# Altium footprint library LimeMicroAltiumLib_pcbLib_r05.PcbLib: 746 footprints (part 36 of 48)
Each footprint in its own frame and in the unit in brackets; x right, y up, seen from the top. Pads: shape width x height; smd on the part's side, far side on the other; paste and mask are expansions set on the pad; w line width, h text height; cw(c..) or ccw(c..) is an arc to the next point about the centre after c.
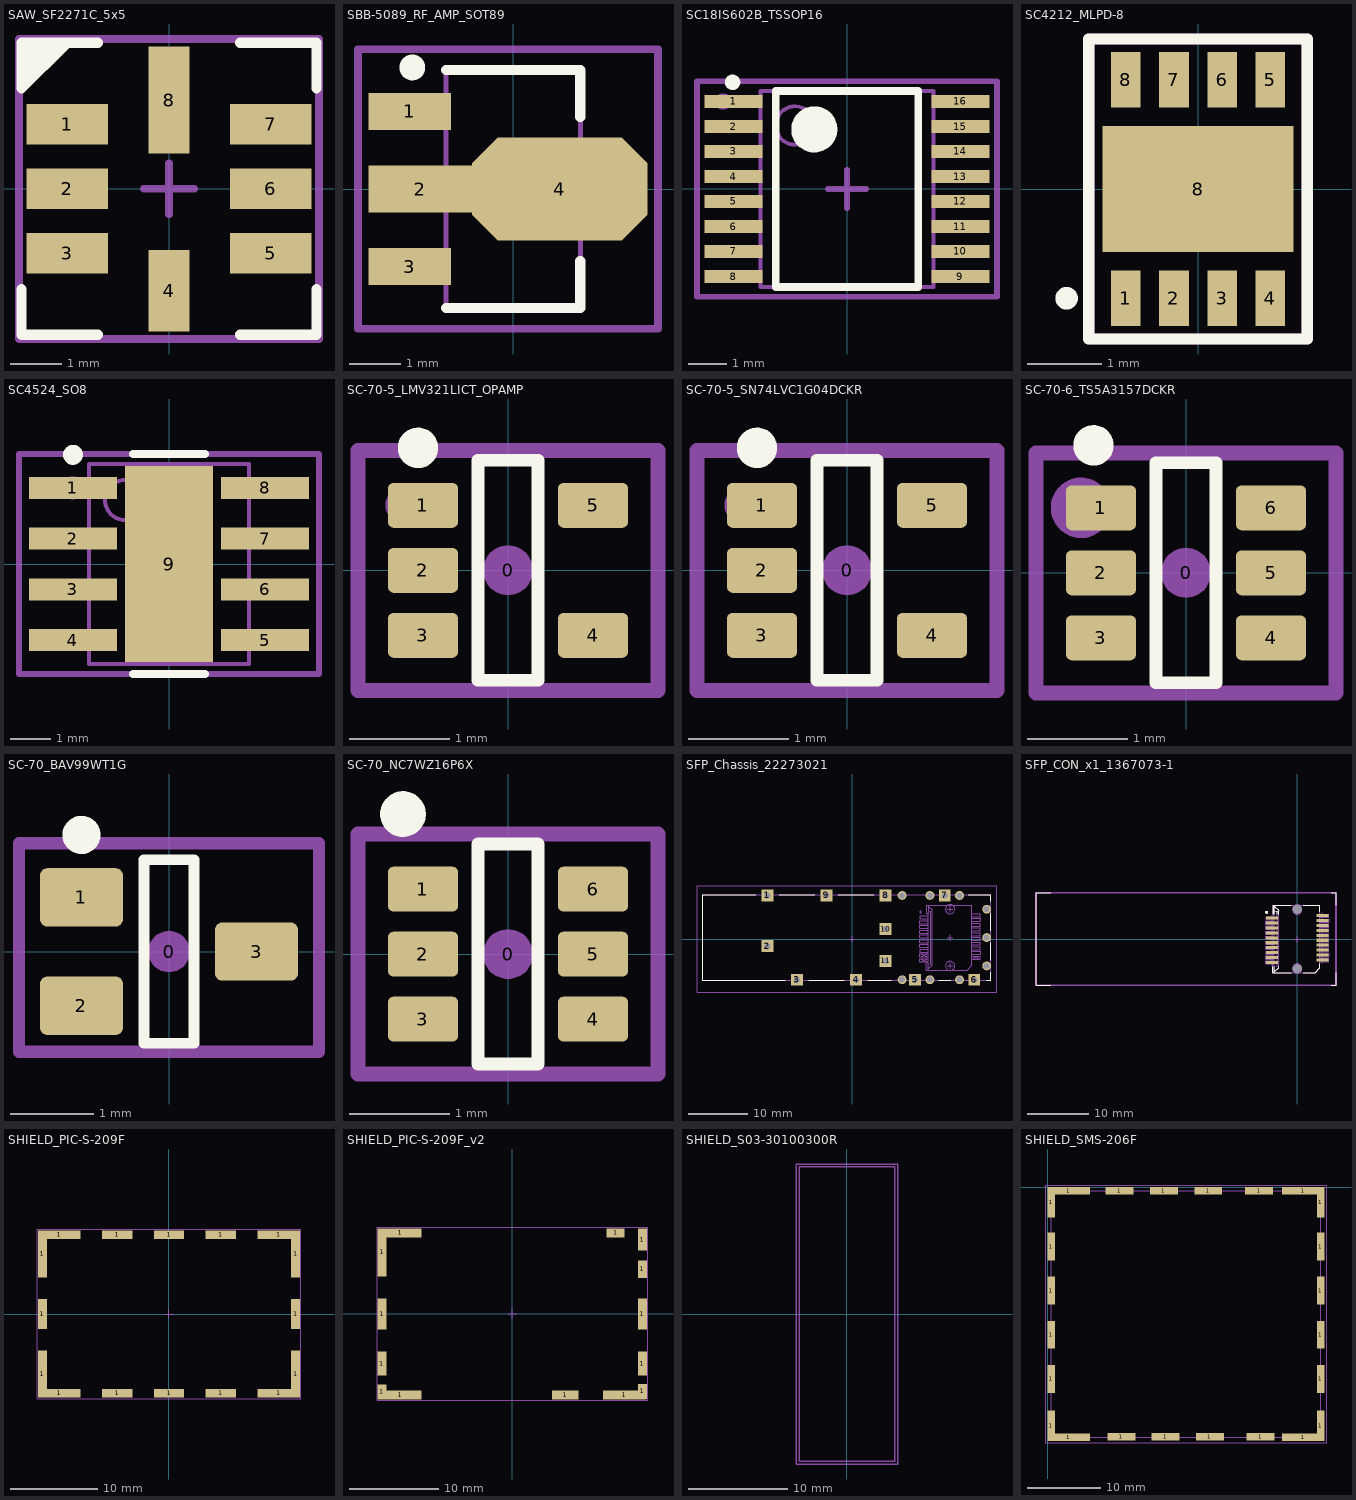
[diagram p35: the footprints below, top view; thin cyan lines are the x and y axes]

## SAW_SF2271C_5x5 [mm]
pads (8):
  rect 1.6x0.8 smd mask+0.05: 1(-2,1.27) 2(-2,0) 3(-2,-1.27) 5(2,-1.27) 6(2,0) 7(2,1.27)
  rect 0.8x1.6 smd mask+0.05: 4(0,-2.005)
  rect 0.8x2.1 smd mask+0.05: 8(0,1.745)
Top Overlay:
  region: -2.9,1.9 -2,2.8 -2,2.9 -2.87,2.9 -2.9,2.87
  lines w0.2: -2.9,-1.97 -2.9,-2.87 -1.4,-2.87 ; -2.035,2.835 -2.9,1.97 -2.9,2.87 -1.4,2.87 ; 1.4,-2.87 2.9,-2.87 2.9,-1.97 ; 1.4,2.87 2.9,2.87 2.9,1.97
Mechanical 15:
  circle w0.25: c-2,1.3 r0.1
  lines w0.15: -0.5,0 0.5,0 ; 0,-0.5 0,0.5 ; -2.95,-2.955 2.95,-2.955 2.95,2.945 -2.95,2.945 -2.95,-2.955
  text ".Designator" at 0,0 h0.55
3D body "User Library-TA0731.step": height 1.7, standoff 0, extent -2.5,-2.5 2.5,2.5

## SBB-5089_RF_AMP_SOT89 [mm]
pads (4):
  rect 1.6x0.711 smd: 1(-2,1.5) 3(-2,-1.5)
  rect 2x0.914 smd: 2(-1.8,0)
  oct 3.4x2 smd: 4(0.9,0)
Top Overlay:
  circle w0.25: c-1.95,2.35 r0.125
  lines w0.2: -1.3,-2.3 1.3,-2.3 1.3,-1.4 ; -1.3,2.3 1.3,2.3 1.3,1.4
Mechanical 13:
  lines w0.1: -1.3,-2.3 1.3,-2.3 1.3,2.3 -1.3,2.3 -1.3,-2.3
Mechanical 15:
  circle w0.15: c-2.125,1.5 r0.056
  lines w0.15: -0.5,0 0.5,0 ; 0,-0.5 0,0.5 ; -3,-2.7 2.8,-2.7 2.8,2.7 -3,2.7 -3,-2.7
  text ".Designator" at 0,0 h0.55
3D body "SW3dPS-SOT89.STEP": height 1.59, standoff -0.02, extent -2.408,-2.286 1.842,2.314

## SC18IS602B_TSSOP16 [mm]
pads (16):
  rect 1.5x0.35 smd mask+0.05: 1(-2.95,2.275) 2(-2.95,1.625) 3(-2.95,0.975) 4(-2.95,0.325) 5(-2.95,-0.325) 6(-2.95,-0.975) 7(-2.95,-1.625) 8(-2.95,-2.275) 9(2.95,-2.275) 10(2.95,-1.625) 11(2.95,-0.975) 12(2.95,-0.325) 13(2.95,0.325) 14(2.95,0.975) 15(2.95,1.625) 16(2.95,2.275)
Top Overlay:
  circle w0.6: c-0.85,1.55 r0.3
  circle w0.25: c-2.975,2.775 r0.075
  lines w0.2: -1.85,-2.55 1.85,-2.55 1.85,2.55 -1.85,2.55 -1.85,-2.55
Mechanical 13:
  circle w0.1: c-1.35,1.65 r0.5
  lines w0.1: -2.25,-2.55 2.25,-2.55 2.25,2.55 -2.25,2.55 -2.25,-2.55
Mechanical 15:
  circle w0.35: c-3.225,2.275 r0.035
  lines w0.15: -0.5,0 0.5,0 ; 0,-0.5 0,0.5 ; -3.9,-2.8 3.9,-2.8 3.9,2.8 -3.9,2.8 -3.9,-2.8
  text ".Designator" at 0,0 h0.55
3D body "User Library-TSSOP-16-1.step": height 1.1, standoff 0, extent -3.2,-2.5 3.2,2.5

## SC4212_MLPD-8 [mm] "SC4212"
height 1.5
pads (9):
  rect 0.4x0.75 smd mask+0.05: 1(-0.975,-1.475) 2(-0.325,-1.475) 3(0.325,-1.475) 4(0.975,-1.475) 5(0.975,1.475) 6(0.325,1.475) 7(-0.325,1.475) 8(-0.975,1.475)
  rect 2.58x1.7 smd mask+0.05: 8(0,0)
Top Overlay:
  circle w0.254: c-1.775,-1.475 r0.025
  lines w0.15: -1.475,-2.025 1.475,-2.025 1.475,2.025 -1.475,2.025 -1.475,-2.025
Mechanical 15:
  circle w0.254: c-0.975,-1.475 r0.025
  lines w0.15: -0.45,0 0,0 ; 0,-0.45 0,0 ; 0,0.45 0,0 ; 0.45,0 0,0 ; -1.475,-2.025 1.475,-2.025 1.475,2.025 -1.475,2.025 -1.475,-2.025
  text ".Designator" at 0,0 h0.55
3D body: height 1, standoff 0, extent -1.5,-1.6 1.5,1.7
3D body: height 1.01, standoff 0, extent -1.2,-1.4 -0.8,-1

## SC4524_SO8 [mm] "SOIC, 8-Leads, Body 4,90x3,90mm, Pitch 1,27mm, IPC Medium Density"
height 1.7
pads (9):
  rect 2.2x0.55 smd mask+0.05: 1(-2.4,1.905) 2(-2.4,0.635) 3(-2.4,-0.635) 4(-2.4,-1.905) 5(2.4,-1.905) 6(2.4,-0.635) 7(2.4,0.635) 8(2.4,1.905)
  rect 2.2x4.9 smd mask+0.05: 9(0,0)
Top Overlay:
  circle w0.25: c-2.4,2.73 r0.125
  lines w0.2: -0.9,-2.75 0.9,-2.75 ; -0.9,2.75 0.9,2.75
Mechanical 13:
  circle w0.1: c-1.1,1.6 r0.5
  lines w0.1: -2,-2.5 2,-2.5 2,2.5 -2,2.5 -2,-2.5
Mechanical 15:
  circle w0.35: c-2.4,1.905 r0.112
  lines w0.15: -0.5,0 0.5,0 ; 0,-0.5 0,0.5 ; -3.75,-2.75 3.75,-2.75 3.75,2.75 -3.75,2.75 -3.75,-2.75
  text ".Designator" at 0,-0.1 h0.55
3D body "CircuitWorks-SO-8.step": height 1.45, standoff 0, extent -2.9,-2.402 2.878,2.5

## SC-70-5_LMV321LICT_OPAMP [mm] "SC-70 (SOT323), 5 pin"
height 1.003
pads (6):
  round 0.5 on Mech15: 0(0,0)
  rrect25% 0.7x0.45 smd: 1(-0.85,0.65) 2(-0.85,0) 3(-0.85,-0.65) 4(0.85,-0.65) 5(0.85,0.65)
Top Overlay:
  circle w0.2: c-0.9,1.225 r0.102
  lines w0.127: -0.3,-1.1 -0.3,1.1 0.3,1.1 0.3,-1.1 -0.3,-1.1
Top Solder:
  region: -1.3,-0.975 -1.3,0.975 -0.4,0.975 -0.4,-0.975
Mechanical 15:
  circle w0.2: c-1.05,0.65 r0.075
  lines w0.15: -1.5,-1.2 -1.5,1.2 1.5,1.2 1.5,-1.2 -1.5,-1.2
  text ".Designator" at 0,0 h0.55
3D body "User Library-SC70-6.step": height 0.92, standoff -0.03, extent -1.05,-1 1.05,1

## SC-70-5_SN74LVC1G04DCKR [mm] "SC-70 (SOT323), 5 pin"
height 1.003
pads (6):
  round 0.5 on Mech15: 0(0,0)
  rrect25% 0.7x0.45 smd: 1(-0.85,0.65) 2(-0.85,0) 3(-0.85,-0.65) 4(0.85,-0.65) 5(0.85,0.65)
Top Overlay:
  circle w0.2: c-0.9,1.225 r0.102
  lines w0.127: -0.3,-1.1 -0.3,1.1 0.3,1.1 0.3,-1.1 -0.3,-1.1
Top Solder:
  region: -1.3,-0.975 -1.3,0.975 -0.4,0.975 -0.4,-0.975
Mechanical 15:
  circle w0.2: c-1.05,0.65 r0.075
  lines w0.15: -1.5,-1.2 -1.5,1.2 1.5,1.2 1.5,-1.2 -1.5,-1.2
  text ".Designator" at 0,0 h0.55
3D body "User Library-SC70-6.step": height 0.92, standoff -0.03, extent -1.05,-1 1.05,1

## SC-70-6_TS5A3157DCKR [mm] "SC-70 (SOT323), 6 pin"
height 1.003
pads (7):
  round 0.5 on Mech15: 0(0,0)
  rrect25% 0.7x0.45 smd: 1(-0.85,0.65) 2(-0.85,0) 3(-0.85,-0.65) 4(0.85,-0.65) 5(0.85,0) 6(0.85,0.65)
Top Overlay:
  circle w0.2: c-0.925,1.275 r0.102
  lines w0.127: -0.3,-1.1 0.3,-1.1 0.3,1.1 -0.3,1.1 -0.3,-1.1
Top Solder:
  region: 1.3,-0.975 0.4,-0.975 0.4,0.975 1.3,0.975
  region: -1.3,-0.975 -0.4,-0.975 -0.4,0.975 -1.3,0.975
  region: -1.3,-0.975
Mechanical 15:
  circle w0.35: c-1.05,0.65 r0.127
  lines w0.15: -1.5,-1.2 1.5,-1.2 1.5,1.2 -1.5,1.2 -1.5,-1.2
  text ".Designator" at 0,0 h0.55
3D body "User Library-SC70-6.step": height 0.92, standoff -0.03, extent -1.05,-1 1.05,1

## SC-70_BAV99WT1G [mm] "SC-70 (SOT323), 3 pin"
height 1.003
pads (4):
  round 0.5 on Mech15: 0(0,0)
  rrect25% 1x0.7 smd: 1(-1.05,0.65) 2(-1.05,-0.65) 3(1.05,0)
Top Overlay:
  circle w0.254: c-1.05,1.4 r0.102
  lines w0.127: -0.3,-1.1 0.3,-1.1 0.3,1.1 -0.3,1.1 -0.3,-1.1
Mechanical 15:
  circle w0.2: c-1.05,0.65 r0.05
  lines w0.15: -1.8,-1.2 1.8,-1.2 1.8,1.3 -1.8,1.3 -1.8,-1.2
  text ".Designator" at 0,0 h0.55
3D body "User Library-sc70-3.step": height 0.99, standoff -0.01, extent -1.15,-1.05 1.15,1.05

## SC-70_NC7WZ16P6X [mm] "SC-70 (SOT323), 6 pin"
height 1.003
pads (7):
  round 0.5 on Mech15: 0(0,0)
  rrect25% 0.7x0.45 smd: 1(-0.85,0.65) 2(-0.85,0) 3(-0.85,-0.65) 4(0.85,-0.65) 5(0.85,0) 6(0.85,0.65)
Top Overlay:
  circle w0.254: c-1.05,1.4 r0.102
  lines w0.127: -0.3,-1.1 0.3,-1.1 0.3,1.1 -0.3,1.1 -0.3,-1.1
Top Solder:
  region: 1.3,-0.975 1.3,0.975 0.4,0.975 0.4,-0.975
  region: -1.3,-0.975 -1.3,0.975 -0.4,0.975 -0.4,-0.975
Mechanical 15:
  circle w0.2: c-1.05,0.65 r0.05
  lines w0.15: -1.5,-1.2 1.5,-1.2 1.5,1.2 -1.5,1.2 -1.5,-1.2
  text ".Designator" at 0,0 h0.55
3D body "User Library-SC70-6.step": height 0.92, standoff -0.03, extent -1.05,-1 1.05,1

## SFP_Chassis_22273021 [mm] "CONN SFP CAGE PRESS-FIT R/A"
pads (20):
  rect 2x2 hole 1.05: 1(-14.351,7.366) 2(-14.351,-1.209) 3(-9.351,-6.884) 4(0.649,-6.884) 5(10.649,-6.884) 6(20.649,-6.884) 7(15.649,7.366) 8(5.649,7.366) 9(-4.351,7.366) 10(5.649,1.691) 11(5.649,-3.709)
  round 1.5 hole 1: 12(8.449,-6.884) 13(13.149,-6.884) 14(18.149,-6.884) 15(22.749,-4.559) 16(22.749,0.241) 17(18.149,7.366) 18(13.149,7.366) 19(8.449,7.366) 20(22.749,5.041)
Top Overlay:
  lines w0.2: -16.351,7.491 -25.251,7.491 -25.251,-7.009 -11.351,-7.009 ; -12.351,7.491 -6.351,7.491 ; -7.351,-7.009 -1.351,-7.009 ; -2.351,7.491 3.649,7.491 ; 2.649,-7.009 6.649,-7.009 ; 14.649,-7.009 16.649,-7.009 ; 19.649,7.491 23.449,7.491 23.449,6.366 ; 22.749,-7.009 23.449,-7.009 23.449,-5.634 ; 23.449,-3.634 23.449,-0.634 ; 23.449,1.366 23.449,4.366
Mechanical 13:
  circle w0.1: c11.594,4.564 r0.125
  circle w0.1: c16.549,-4.559 r0.775
  circle w0.1: c16.549,5.041 r0.775
  lines w0.1: 12.849,-5.259 12.849,-3.859 ; 12.849,-5.059 13.569,-4.459 13.569,-4.259 ; 12.849,-4.196 13.569,-4.259 ; 12.849,-2.209 11.449,-2.209 11.449,-1.709 12.849,-1.709 ; 12.849,-1.409 11.449,-1.409 11.449,-0.909 12.849,-0.909 ; 12.849,-0.609 11.449,-0.609 11.449,-0.109 12.849,-0.109 ; 12.849,0.191 11.449,0.191 11.449,0.691 12.849,0.691 ; 12.849,0.991 11.449,0.991 11.449,1.491 12.849,1.491 ; 12.849,1.791 11.449,1.791 11.449,2.291 12.849,2.291 ; 12.849,2.591 11.449,2.591 11.449,3.091 12.849,3.091 ; 12.849,3.391 11.449,3.391 11.449,3.891 12.849,3.891 ; 12.849,4.678 13.569,4.741 ; 12.849,5.541 13.564,4.941 13.569,4.941 13.569,4.741 ; 12.849,5.741 12.849,4.341 ; 13.326,-4.238 13.326,4.72 ; 16.049,-4.559 16.549,-4.559 ; 16.049,0.246 16.549,0.246 ; 16.049,5.041 16.549,5.041 ; 16.549,-5.059 16.549,-4.559 ; 16.549,-4.059 16.549,-4.559 ; 16.549,-0.254 16.549,0.246 ; 16.549,0.746 16.549,0.246 ; 16.549,4.541 16.549,5.041 ; 16.549,5.541 16.549,5.041 ; 17.049,-4.559 16.549,-4.559 ; 17.049,0.246 16.549,0.246 ; 17.049,5.041 16.549,5.041 ; 20.249,-2.609 21.649,-2.609 21.649,-2.109 20.249,-2.109 ; 20.249,-1.809 21.649,-1.809 21.649,-1.309 20.249,-1.309 ; 20.249,-1.009 21.649,-1.009 21.649,-0.509 20.249,-0.509 ; 20.249,-0.209 21.649,-0.209 21.649,0.291 20.249,0.291 ; 20.249,0.591 21.649,0.591 21.649,1.091 20.249,1.091 ; 20.249,1.391 21.649,1.391 21.649,1.891 20.249,1.891 ; 20.249,2.191 21.649,2.191 21.649,2.691 20.249,2.691 ; 20.249,2.991 21.649,2.991 21.649,3.491 20.249,3.491 ; 20.249,3.791 21.649,3.791 21.649,4.291 20.249,4.291 ; 11.449,-3.809 12.849,-3.309 11.449,-3.309 ; 11.449,-3.809 11.449,-3.309 ; 11.449,-3.809 12.849,-3.809 11.449,-3.309 ; 11.449,-3.009 12.849,-2.509 11.449,-2.509 ; 11.449,-3.009 11.449,-2.509 ; 11.449,-3.009 12.849,-3.009 11.449,-2.509 ; 12.849,-3.859 12.549,-3.859 12.549,-5.259 19.449,-5.259 20.249,-4.459 20.249,5.741 12.549,5.741 12.549,4.341 12.849,4.341 ; 12.849,-3.859 12.849,4.341 ; 13.569,-4.259 13.569,4.741 ; 21.649,-3.409 20.249,-2.909 21.649,-2.909 ; 21.649,-3.409 21.649,-2.909 ; 21.649,-3.409 20.249,-3.409 21.649,-2.909
  lines w0.2: -25.251,-7.009 -25.251,7.491 23.449,7.491 23.449,-7.009 -25.251,-7.009
Mechanical 15:
  lines w0.15: -0.5,0 0.5,0 ; 0,-0.5 0,0.5
  lines w0.2: -26.251,-9 -26.251,9 24.499,9 24.499,-9 -26.251,-9
  text ".Designator" at 0,0 h0.55
3D body "2227302-1.stp": height 10.43, standoff -2.95, extent -25.951,-7.726 22.749,8.118

## SFP_CON_x1_1367073-1 [mm] "CONN SFP RCPT 20POS SLD R/A SMD"
height 1.55
pads (22):
  rect 2x0.5 smd: 1(-4.1,3.395) 2(-4.1,2.595) 3(-4.1,1.795) 4(-4.1,0.995) 5(-4.1,0.195) 6(-4.1,-0.605) 7(-4.1,-1.405) 8(-4.1,-2.205) 9(-4.1,-3.005) 10(-4.1,-3.805) 11(4.1,-3.405) 12(4.1,-2.605) 13(4.1,-1.805) 14(4.1,-1.005) 15(4.1,-0.205) 16(4.1,0.595) 17(4.1,1.395) 18(4.1,2.195) 19(4.1,2.995) 20(4.1,3.795)
  round 1 hole 1.55 unplated mask+0.28: MTG1(0,4.795) MTG2(0,-4.805)
Top Overlay:
  circle w0.25: c-4.955,4.318 r0.125
  lines w0.2: -42.4,7.475 -42.4,-7.499 -40,-7.499 ; -42.4,7.499 -40,7.499 ; -4,-4.505 -4,-5.505 -0.944,-5.505 ; -3.7,-5.505 -3.7,-4.505 ; -3.7,-5.305 -2.98,-4.705 -2.98,-4.505 ; -3.7,4.045 -3.7,5.495 ; -3.7,4.095 -4,4.095 -4,5.495 -0.944,5.495 ; -3.7,4.432 -2.98,4.495 ; -3.7,5.295 -2.98,4.695 -2.98,4.045 ; -3.223,4.045 -3.223,4.474 ; 0.944,-5.505 2.9,-5.505 3.7,-4.705 3.7,-4.055 ; 0.944,5.495 3.7,5.495 3.7,4.445 ; 5.5,-7.499 6.3,-7.499 6.3,-5.502 ; 5.5,7.499 6.3,7.499 6.3,5.502
Mechanical 13:
  circle w0.1: c-4.955,4.318 r0.125
  circle w0.1: c0,-4.805 r0.775
  circle w0.1: c0,4.795 r0.775
  lines w0.1: -4.6,-3.805 -4.1,-3.805 -3.6,-3.805 ; -4.6,-3.005 -4.1,-3.005 -3.6,-3.005 ; -4.6,-2.205 -4.1,-2.205 -3.6,-2.205 ; -4.6,-1.405 -4.1,-1.405 -3.6,-1.405 ; -4.6,-0.605 -4.1,-0.605 -3.6,-0.605 ; -4.6,0.195 -4.1,0.195 -3.6,0.195 ; -4.6,0.995 -4.1,0.995 -3.6,0.995 ; -4.6,1.795 -4.1,1.795 -3.6,1.795 ; -4.6,2.595 -4.1,2.595 -3.6,2.595 ; -4.6,3.395 -4.1,3.395 -3.6,3.395 ; -4.1,-4.305 -4.1,3.895 ; -3.7,-5.505 -3.7,-4.105 ; -3.7,-5.305 -2.98,-4.705 -2.98,-4.505 ; -3.7,-4.442 -2.98,-4.505 ; -3.7,-4.055 -5.1,-4.055 -5.1,-3.555 -3.7,-3.555 ; -3.7,-3.255 -5.1,-3.255 -5.1,-2.755 -3.7,-2.755 ; -3.7,-2.455 -5.1,-2.455 -5.1,-1.955 -3.7,-1.955 ; -3.7,-1.655 -5.1,-1.655 -5.1,-1.155 -3.7,-1.155 ; -3.7,-0.855 -5.1,-0.855 -5.1,-0.355 -3.7,-0.355 ; -3.7,-0.055 -5.1,-0.055 -5.1,0.445 -3.7,0.445 ; -3.7,0.745 -5.1,0.745 -5.1,1.245 -3.7,1.245 ; -3.7,1.545 -5.1,1.545 -5.1,2.045 -3.7,2.045 ; -3.7,2.345 -5.1,2.345 -5.1,2.845 -3.7,2.845 ; -3.7,3.145 -5.1,3.145 -5.1,3.645 -3.7,3.645 ; -3.7,4.432 -2.98,4.495 ; -3.7,5.295 -2.985,4.695 -2.98,4.695 -2.98,4.495 ; -3.7,5.495 -3.7,4.095 ; -3.223,-4.484 -3.223,4.474 ; -0.5,-4.805 0,-4.805 ; -0.5,0 0,0 ; -0.5,4.795 0,4.795 ; 0,-5.305 0,-4.805 ; 0,-4.305 0,-4.805 ; 0,-0.5 0,0 ; 0,0.5 0,0 ; 0,4.295 0,4.795 ; 0,5.295 0,4.795 ; 0.5,-4.805 0,-4.805 ; 0.5,0 0,0 ; 0.5,4.795 0,4.795 ; 3.6,-3.405 4.1,-3.405 4.6,-3.405 ; 3.6,-2.605 4.1,-2.605 4.6,-2.605 ; 3.6,-1.805 4.1,-1.805 4.6,-1.805 ; 3.6,-1.005 4.1,-1.005 4.6,-1.005 ; 3.6,-0.205 4.1,-0.205 4.6,-0.205 ; 3.6,0.595 4.1,0.595 4.6,0.595 ; 3.6,1.395 4.1,1.395 4.6,1.395 ; 3.6,2.195 4.1,2.195 4.6,2.195 ; 3.6,2.995 4.1,2.995 4.6,2.995 ; 3.6,3.795 4.1,3.795 4.6,3.795 ; 3.7,-3.655 5.1,-3.655 5.1,-3.155 3.7,-3.155 ; 3.7,-2.855 5.1,-2.855 5.1,-2.355 3.7,-2.355 ; 3.7,-2.055 5.1,-2.055 5.1,-1.555 3.7,-1.555 ; 3.7,-1.255 5.1,-1.255 5.1,-0.755 3.7,-0.755 ; 3.7,-0.455 5.1,-0.455 5.1,0.045 3.7,0.045 ; 3.7,0.345 5.1,0.345 5.1,0.845 3.7,0.845 ; 3.7,1.145 5.1,1.145 5.1,1.645 3.7,1.645 ; 3.7,1.945 5.1,1.945 5.1,2.445 3.7,2.445 ; 3.7,2.745 5.1,2.745 5.1,3.245 3.7,3.245 ; 3.7,3.545 5.1,3.545 5.1,4.045 3.7,4.045 ; 4.1,-3.905 4.1,4.295 ; -3.7,-4.105 -4,-4.105 -4,-5.505 2.9,-5.505 3.7,-4.705 3.7,5.495 -4,5.495 -4,4.095 -3.7,4.095 ; -3.7,-4.105 -3.7,4.095 ; -2.98,-4.505 -2.98,4.495
Mechanical 15:
  circle w0.25: c-4.955,4.318 r0.125
  circle w0.1: c-4.955,4.318 r0.125
  lines w0.15: -0.525,0 0.475,0 ; -0.025,-0.5 -0.025,0.5
  lines w0.2: -4,-4.505 -4,-5.505 -0.944,-5.505 ; -3.7,-5.505 -3.7,-4.505 ; -3.7,-5.305 -2.98,-4.705 -2.98,-4.505 ; -3.7,4.045 -3.7,5.495 ; -3.7,4.095 -4,4.095 -4,5.495 -0.944,5.495 ; -3.7,4.432 -2.98,4.495 ; -3.7,5.295 -2.98,4.695 -2.98,4.045 ; -3.223,4.045 -3.223,4.474 ; 0.944,-5.505 2.9,-5.505 3.7,-4.705 3.7,-4.055 ; 0.944,5.495 3.7,5.495 3.7,4.445
  lines w0.3: -42.4,-7.5 6.3,-7.5 6.3,7.5 -42.4,7.5 -42.4,-7.5
  text ".Designator" at -0.025,0 h0.55
3D body "sfp-30k-gsf.step": height 9.89, standoff -2.43, extent -50.872,-6.769 4.5,6.82
3D body "TYCO_1367073-1.stp": height 5.22, standoff -0.81, extent -4.5,-5.505 4.5,5.495

## SHIELD_PIC-S-209F [mm]
pads (16):
  rect 1x5.4 smd mask+0.05: 1(-14.55,-6.925) 1(-14.55,6.925) 1(14.55,-6.925) 1(14.55,6.925)
  rect 1x3.5 smd mask+0.05: 1(-14.55,0) 1(14.55,0)
  rect 4.85x1 smd mask+0.05: 1(-12.625,-9.125) 1(-12.625,9.125) 1(12.625,-9.125) 1(12.625,9.125)
  rect 3.5x1 smd mask+0.05: 1(-5.975,-9.125) 1(-5.975,9.125) 1(0,-9.125) 1(0,9.125) 1(5.975,-9.125) 1(5.975,9.125)
Mechanical 15:
  lines w0.1: -0.5,0 0,0 ; 0,-0.5 0,0 ; 0,0.5 0,0 ; 0.5,0 0,0 ; -15.15,-9.725 15.15,-9.725 15.15,9.725 -15.15,9.725 -15.15,-9.725
  text ".Designator" at 0,0 h0.55
  text "RFI shield frame" at -3.7,-9.2 h0.55

## SHIELD_PIC-S-209F_v2 [mm]
pads (14):
  rect 1x1.7 smd mask+0.05: 1(-14.675,-8.8) 1(14.625,-8.725)
  rect 1x2.7 smd mask+0.05: 1(-14.675,-5.6) 1(14.625,-5.6)
  rect 1x3.5 smd mask+0.05: 1(-14.675,-0.025) 1(14.625,-0.025)
  rect 1x5.4 smd mask+0.05: 1(-14.675,6.9)
  rect 4.85x1 smd mask+0.05: 1(-12.65,-9.15) 1(-12.65,9.1) 1(12.6,-9.15)
  rect 3x1 smd mask+0.05: 1(5.95,-9.15)
  rect 2x1 smd mask+0.05: 1(11.6,9.1)
  rect 1x2 smd mask+0.05: 1(14.625,5)
  rect 1x2.5 smd mask+0.05: 1(14.625,8.35)
Mechanical 15:
  lines w0.1: -0.5,0 0,0 ; 0,-0.5 0,0 ; 0,0.5 0,0 ; 0.5,0 0,0 ; -15.225,-9.725 -15.225,9.725 15.225,9.725 15.225,-9.725 -15.225,-9.725
  text "RFI shield frame" at -3.775,-9.2 h0.55
  text ".Designator" at 0,0 h0.55

## SHIELD_S03-30100300R [mm] "RF Shield CAN 0.394\" (10.00mm) X 1.181\" (30.00mm) Non-Vented Surface Mount"
Mechanical 13:
  lines w0.1: -5.075,-15.025 -5.075,15.075 5.075,15.075 5.075,-15.025 -5.075,-15.025
Mechanical 15:
  lines w0.15: -5.1,-15.025 -5.1,15.075 5.1,15.075 5.1,-15.025 -5.1,-15.025 ; -4.8,-14.725 -4.8,14.775 4.8,14.775 4.8,-14.725 -4.8,-14.725
  text ".Designator" at 0.075,-0.375 h0.55
  text "RF shield" at -2.5,-13.625 h0.55
3D body "s03-30100300.stp": height 3.4, standoff 0.25, extent -5.075,-15.075 5.075,15.075

## SHIELD_SMS-206F [mm] "RF Shield  Frame+Cover 1.348\" (34.24mm) X 1.472\" (37.39mm) Vented Surface Mount"
pads (24):
  rect 1x4.14 smd mask+0.05: 1(0.5,-32.402) 1(0.5,-2.075) 1(37.143,-32.402) 1(37.143,-2.075)
  rect 1x3.785 smd mask+0.05: 1(0.5,-26.055) 1(0.5,-20.06) 1(0.5,-14.065) 1(0.5,-8.07) 1(37.143,-26.055) 1(37.143,-20.06) 1(37.143,-14.065) 1(37.143,-8.07)
  rect 5.715x1 smd mask+0.05: 1(2.9,-33.977) 1(2.9,-0.5) 1(34.743,-33.977) 1(34.743,-0.5)
  rect 3.81x1 smd mask+0.05: 1(9.8,-0.5) 1(10.025,-33.925) 1(28.75,-0.5) 1(28.975,-33.925)
  rect 3.785x1 smd mask+0.05: 1(15.825,-0.5) 1(16.05,-33.925) 1(21.85,-0.5) 1(22.075,-33.925)
Mechanical 13:
  lines w0.1: 0.5,-33.977 37.143,-33.977 37.143,-0.5 0.5,-0.5 0.5,-33.977
Mechanical 15:
  lines w0.15: -0.25,-34.75 37.925,-34.75 37.925,0.275 -0.25,0.275 -0.25,-34.75
  text "RF shield" at 31.15,-33.05 h0.55
  text ".Designator" at 18.375,-17.15 h0.55